# Altium footprint library Pezo_imp.PCBLIB: 98 footprints (part 5 of 7)
Each footprint in its own frame and in the unit in brackets; x right, y up, seen from the top. Pads: shape width x height; smd on the part's side, far side on the other; paste and mask are expansions set on the pad; w line width, h text height; cw(c..) or ccw(c..) is an arc to the next point about the centre after c.
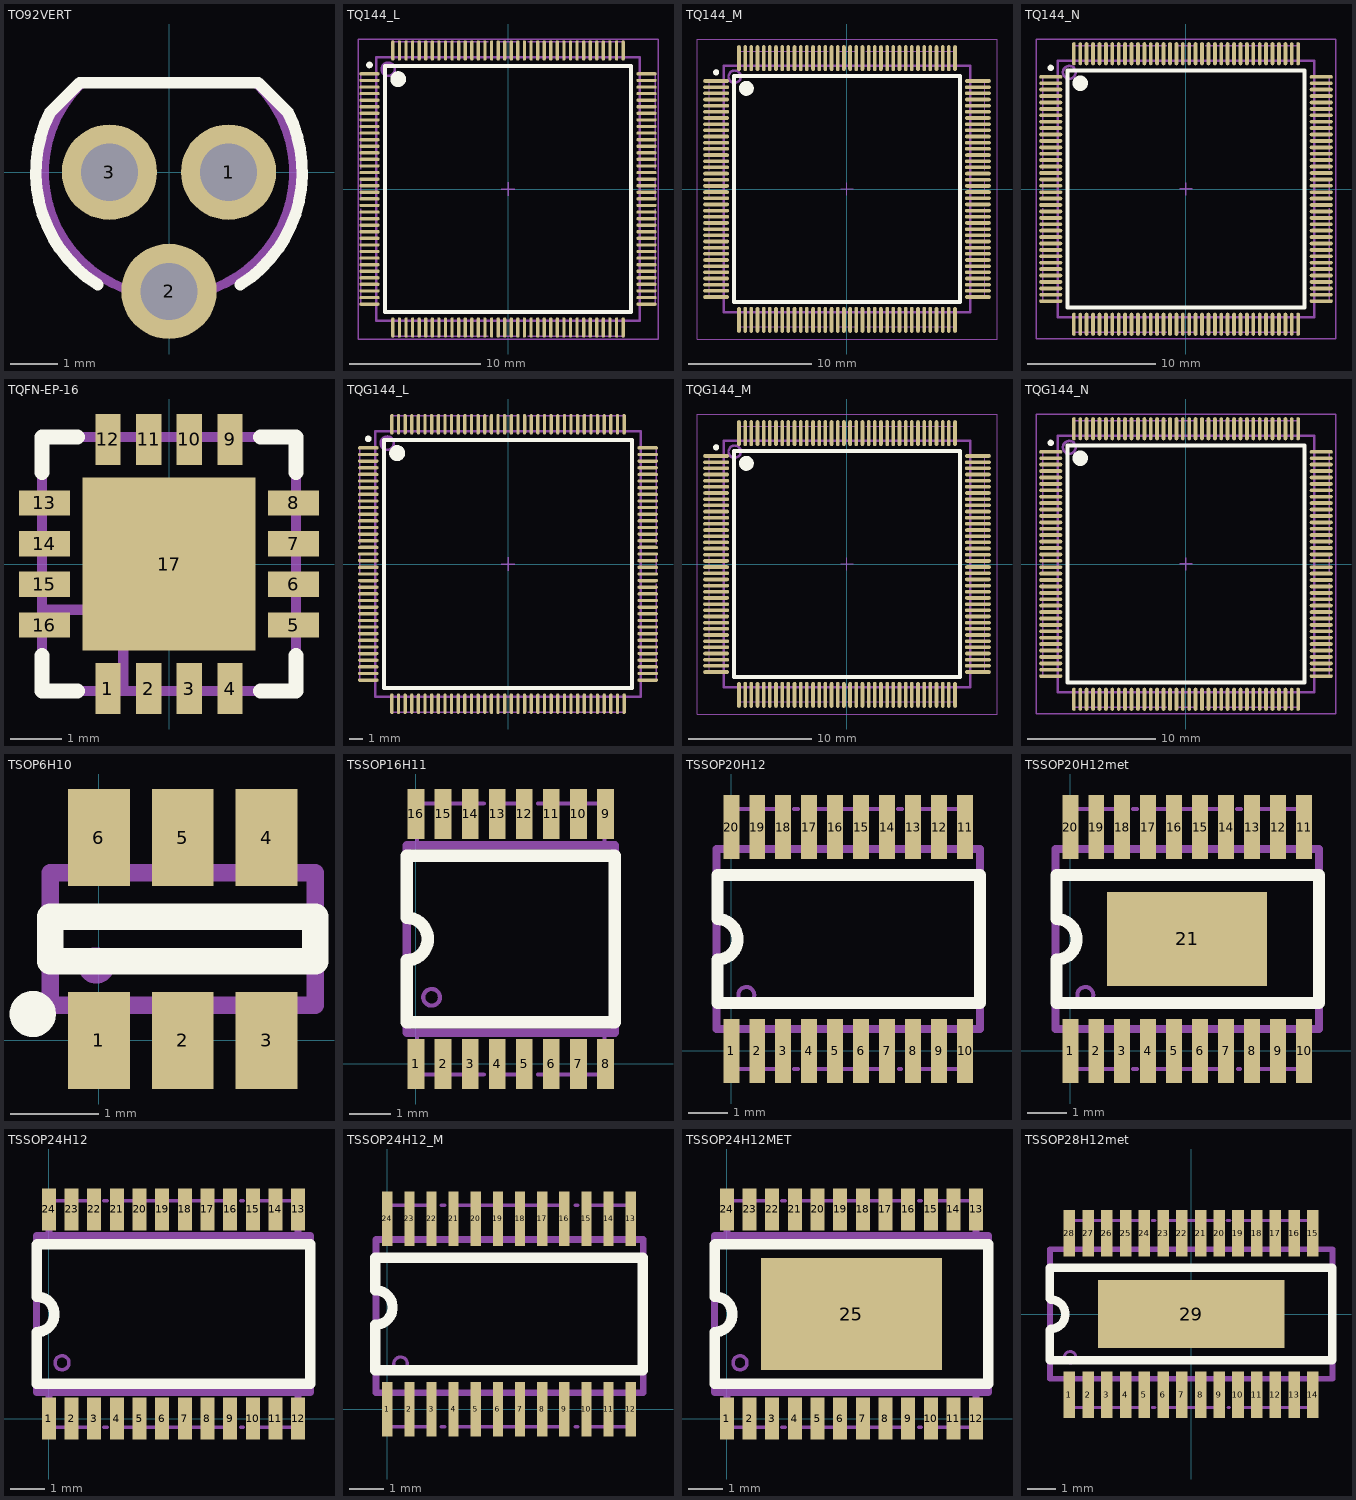
[diagram p4: the footprints below, top view; thin cyan lines are the x and y axes]

## TO92VERT [mil]
height 342.52
pads (3):
  round 80 hole 48: 1(50,0) 2(0,-100) 3(-50,0)
Top Overlay:
  lines w9.84: -100,50 -75,75 75,75 100,50 ; -99.97,50.06 ccw(c0,0) -59.74,-94.5 ; 59.74,-94.5 ccw(c0,0) 99.97,50.06
Mechanical 1:
  lines w7.87: -75,75 75,75 ; -74,74 ccw(c0,0) 74,74
  text "2" at -28.65,-114.48 h83.33
  text "1" at 21.35,-24.48 h83.33
  text "3" at -78.65,-24.48 h83.33
  text ".Designator" at -49.61,95.28 h59.06
3D body "TO92VERT.stp": height 342.52, standoff -118.11, extent -101.56,-109.82 101.56,62.99

## TQ144_L [mm] "Thin QFP, 144-Leads, Body 20x20mm, Pitch 0.5mm, IPC High Density"
height 1.6
pads (144):
  oval 1.55x0.25 smd: 1(-10.525,8.75) 2(-10.525,8.25) 3(-10.525,7.75) 4(-10.525,7.25) 5(-10.525,6.75) 6(-10.525,6.25) 7(-10.525,5.75) 8(-10.525,5.25) 9(-10.525,4.75) 10(-10.525,4.25) 11(-10.525,3.75) 12(-10.525,3.25) 13(-10.525,2.75) 14(-10.525,2.25) 15(-10.525,1.75) 16(-10.525,1.25) 17(-10.525,0.75) 18(-10.525,0.25) 19(-10.525,-0.25) 20(-10.525,-0.75) 21(-10.525,-1.25) 22(-10.525,-1.75) 23(-10.525,-2.25) 24(-10.525,-2.75) 25(-10.525,-3.25) 26(-10.525,-3.75) 27(-10.525,-4.25) 28(-10.525,-4.75) 29(-10.525,-5.25) 30(-10.525,-5.75) 31(-10.525,-6.25) 32(-10.525,-6.75) 33(-10.525,-7.25) 34(-10.525,-7.75) 35(-10.525,-8.25) 36(-10.525,-8.75) 73(10.525,-8.75) 74(10.525,-8.25) 75(10.525,-7.75) 76(10.525,-7.25) 77(10.525,-6.75) 78(10.525,-6.25) 79(10.525,-5.75) 80(10.525,-5.25) 81(10.525,-4.75) 82(10.525,-4.25) 83(10.525,-3.75) 84(10.525,-3.25) 85(10.525,-2.75) 86(10.525,-2.25) 87(10.525,-1.75) 88(10.525,-1.25) 89(10.525,-0.75) 90(10.525,-0.25) 91(10.525,0.25) 92(10.525,0.75) 93(10.525,1.25) 94(10.525,1.75) 95(10.525,2.25) 96(10.525,2.75) 97(10.525,3.25) 98(10.525,3.75) 99(10.525,4.25) 100(10.525,4.75) 101(10.525,5.25) 102(10.525,5.75) 103(10.525,6.25) 104(10.525,6.75) 105(10.525,7.25) 106(10.525,7.75) 107(10.525,8.25) 108(10.525,8.75)
  oval 0.25x1.55 smd: 37(-8.75,-10.525) 38(-8.25,-10.525) 39(-7.75,-10.525) 40(-7.25,-10.525) 41(-6.75,-10.525) 42(-6.25,-10.525) 43(-5.75,-10.525) 44(-5.25,-10.525) 45(-4.75,-10.525) 46(-4.25,-10.525) 47(-3.75,-10.525) 48(-3.25,-10.525) 49(-2.75,-10.525) 50(-2.25,-10.525) 51(-1.75,-10.525) 52(-1.25,-10.525) 53(-0.75,-10.525) 54(-0.25,-10.525) 55(0.25,-10.525) 56(0.75,-10.525) 57(1.25,-10.525) 58(1.75,-10.525) 59(2.25,-10.525) 60(2.75,-10.525) 61(3.25,-10.525) 62(3.75,-10.525) 63(4.25,-10.525) 64(4.75,-10.525) 65(5.25,-10.525) 66(5.75,-10.525) 67(6.25,-10.525) 68(6.75,-10.525) 69(7.25,-10.525) 70(7.75,-10.525) 71(8.25,-10.525) 72(8.75,-10.525) 109(8.75,10.525) 110(8.25,10.525) 111(7.75,10.525) 112(7.25,10.525) 113(6.75,10.525) 114(6.25,10.525) 115(5.75,10.525) 116(5.25,10.525) 117(4.75,10.525) 118(4.25,10.525) 119(3.75,10.525) 120(3.25,10.525) 121(2.75,10.525) 122(2.25,10.525) 123(1.75,10.525) 124(1.25,10.525) 125(0.75,10.525) 126(0.25,10.525) 127(-0.25,10.525) 128(-0.75,10.525) 129(-1.25,10.525) 130(-1.75,10.525) 131(-2.25,10.525) 132(-2.75,10.525) 133(-3.25,10.525) 134(-3.75,10.525) 135(-4.25,10.525) 136(-4.75,10.525) 137(-5.25,10.525) 138(-5.75,10.525) 139(-6.25,10.525) 140(-6.75,10.525) 141(-7.25,10.525) 142(-7.75,10.525) 143(-8.25,10.525) 144(-8.75,10.525)
Top Overlay:
  circle w0.25: c-10.525,9.425 r0.125
  circle w0.6: c-8.35,8.35 r0.3
  lines w0.3: -9.35,-9.35 -9.35,9.35 9.35,9.35 9.35,-9.35 -9.35,-9.35
Mechanical 1:
  circle w0.2: c-9.1,9.1 r0.5
  lines w0.1: -11.176,-8.763 -11.176,-1.5 ; -11.176,-0.762 -11.176,0.762 ; -11.176,1.5 -11.176,8.763 ; -8.763,-11.176 -1.5,-11.176 ; -8.763,11.176 -1.5,11.176 ; -0.762,-11.176 0.762,-11.176 ; -0.762,11.176 0.762,11.176 ; 1.5,-11.176 8.763,-11.176 ; 1.5,11.176 8.763,11.176 ; 11.176,-8.763 11.176,-1.5 ; 11.176,-0.762 11.176,0.762 ; 11.176,1.5 11.176,8.763
  lines w0.2: -11.176,-8.763 -10,-8.763 ; -11.176,8.763 -10,8.763 ; -8.763,-11.176 -8.763,-10 ; -8.763,10 -8.763,11.176 ; 8.763,-11.176 8.763,-10 ; 8.763,10 8.763,11.176 ; 10,-8.763 11.176,-8.763 ; 10,8.763 11.176,8.763 ; -10,-10 10,-10 10,10 -10,10 -10,-10
  text ".Comment" at -2.9,-1.7 h1.5
  text ".Designator" at -1.61,0.85 h1.5
Mechanical 15:
  lines w0.1: -0.5,0 0.5,0 ; 0,-0.5 0,0.5 ; -11.4,-11.4 -11.4,11.4 11.4,11.4 11.4,-11.4 -11.4,-11.4
3D body: height 1.6, standoff 0, extent -10,-10 10,10

## TQ144_M [mm] "Thin QFP, 144-Leads, Body 20x20mm, Pitch 0.5mm, IPC Low Density"
height 1.6
pads (144):
  oval 2.1x0.3 smd: 1(-10.6,8.75) 2(-10.6,8.25) 3(-10.6,7.75) 4(-10.6,7.25) 5(-10.6,6.75) 6(-10.6,6.25) 7(-10.6,5.75) 8(-10.6,5.25) 9(-10.6,4.75) 10(-10.6,4.25) 11(-10.6,3.75) 12(-10.6,3.25) 13(-10.6,2.75) 14(-10.6,2.25) 15(-10.6,1.75) 16(-10.6,1.25) 17(-10.6,0.75) 18(-10.6,0.25) 19(-10.6,-0.25) 20(-10.6,-0.75) 21(-10.6,-1.25) 22(-10.6,-1.75) 23(-10.6,-2.25) 24(-10.6,-2.75) 25(-10.6,-3.25) 26(-10.6,-3.75) 27(-10.6,-4.25) 28(-10.6,-4.75) 29(-10.6,-5.25) 30(-10.6,-5.75) 31(-10.6,-6.25) 32(-10.6,-6.75) 33(-10.6,-7.25) 34(-10.6,-7.75) 35(-10.6,-8.25) 36(-10.6,-8.75) 73(10.6,-8.75) 74(10.6,-8.25) 75(10.6,-7.75) 76(10.6,-7.25) 77(10.6,-6.75) 78(10.6,-6.25) 79(10.6,-5.75) 80(10.6,-5.25) 81(10.6,-4.75) 82(10.6,-4.25) 83(10.6,-3.75) 84(10.6,-3.25) 85(10.6,-2.75) 86(10.6,-2.25) 87(10.6,-1.75) 88(10.6,-1.25) 89(10.6,-0.75) 90(10.6,-0.25) 91(10.6,0.25) 92(10.6,0.75) 93(10.6,1.25) 94(10.6,1.75) 95(10.6,2.25) 96(10.6,2.75) 97(10.6,3.25) 98(10.6,3.75) 99(10.6,4.25) 100(10.6,4.75) 101(10.6,5.25) 102(10.6,5.75) 103(10.6,6.25) 104(10.6,6.75) 105(10.6,7.25) 106(10.6,7.75) 107(10.6,8.25) 108(10.6,8.75)
  oval 0.3x2.1 smd: 37(-8.75,-10.6) 38(-8.25,-10.6) 39(-7.75,-10.6) 40(-7.25,-10.6) 41(-6.75,-10.6) 42(-6.25,-10.6) 43(-5.75,-10.6) 44(-5.25,-10.6) 45(-4.75,-10.6) 46(-4.25,-10.6) 47(-3.75,-10.6) 48(-3.25,-10.6) 49(-2.75,-10.6) 50(-2.25,-10.6) 51(-1.75,-10.6) 52(-1.25,-10.6) 53(-0.75,-10.6) 54(-0.25,-10.6) 55(0.25,-10.6) 56(0.75,-10.6) 57(1.25,-10.6) 58(1.75,-10.6) 59(2.25,-10.6) 60(2.75,-10.6) 61(3.25,-10.6) 62(3.75,-10.6) 63(4.25,-10.6) 64(4.75,-10.6) 65(5.25,-10.6) 66(5.75,-10.6) 67(6.25,-10.6) 68(6.75,-10.6) 69(7.25,-10.6) 70(7.75,-10.6) 71(8.25,-10.6) 72(8.75,-10.6) 109(8.75,10.6) 110(8.25,10.6) 111(7.75,10.6) 112(7.25,10.6) 113(6.75,10.6) 114(6.25,10.6) 115(5.75,10.6) 116(5.25,10.6) 117(4.75,10.6) 118(4.25,10.6) 119(3.75,10.6) 120(3.25,10.6) 121(2.75,10.6) 122(2.25,10.6) 123(1.75,10.6) 124(1.25,10.6) 125(0.75,10.6) 126(0.25,10.6) 127(-0.25,10.6) 128(-0.75,10.6) 129(-1.25,10.6) 130(-1.75,10.6) 131(-2.25,10.6) 132(-2.75,10.6) 133(-3.25,10.6) 134(-3.75,10.6) 135(-4.25,10.6) 136(-4.75,10.6) 137(-5.25,10.6) 138(-5.75,10.6) 139(-6.25,10.6) 140(-6.75,10.6) 141(-7.25,10.6) 142(-7.75,10.6) 143(-8.25,10.6) 144(-8.75,10.6)
Top Overlay:
  circle w0.25: c-10.6,9.45 r0.125
  circle w0.6: c-8.15,8.15 r0.3
  lines w0.3: -9.15,-9.15 -9.15,9.15 9.15,9.15 9.15,-9.15 -9.15,-9.15
Mechanical 1:
  circle w0.2: c-9.1,9.1 r0.5
  lines w0.1: -11.176,-8.763 -11.176,-1.5 ; -11.176,-0.762 -11.176,0.762 ; -11.176,1.5 -11.176,8.763 ; -8.763,-11.176 -1.5,-11.176 ; -8.763,11.176 -1.5,11.176 ; -0.762,-11.176 0.762,-11.176 ; -0.762,11.176 0.762,11.176 ; 1.5,-11.176 8.763,-11.176 ; 1.5,11.176 8.763,11.176 ; 11.176,-8.763 11.176,-1.5 ; 11.176,-0.762 11.176,0.762 ; 11.176,1.5 11.176,8.763
  lines w0.2: -11.176,-8.763 -10,-8.763 ; -11.176,8.763 -10,8.763 ; -8.763,-11.176 -8.763,-10 ; -8.763,10 -8.763,11.176 ; 8.763,-11.176 8.763,-10 ; 8.763,10 8.763,11.176 ; 10,-8.763 11.176,-8.763 ; 10,8.763 11.176,8.763 ; -10,-10 -10,10 10,10 10,-10 -10,-10
  text ".Comment" at -2.9,-1.7 h1.5
  text ".Designator" at -1.61,0.85 h1.5
Mechanical 15:
  lines w0.1: -0.5,0 0.5,0 ; 0,-0.5 0,0.5 ; -12.15,-12.15 -12.15,12.15 12.15,12.15 12.15,-12.15 -12.15,-12.15
3D body: height 1.6, standoff 0, extent -10,-10 10,10

## TQ144_N [mm] "Thin QFP, 144-Leads, Body 20x20mm, Pitch 0.5mm, IPC Medium Density"
height 1.6
pads (144):
  oval 1.8x0.3 smd: 1(-10.55,8.75) 2(-10.55,8.25) 3(-10.55,7.75) 4(-10.55,7.25) 5(-10.55,6.75) 6(-10.55,6.25) 7(-10.55,5.75) 8(-10.55,5.25) 9(-10.55,4.75) 10(-10.55,4.25) 11(-10.55,3.75) 12(-10.55,3.25) 13(-10.55,2.75) 14(-10.55,2.25) 15(-10.55,1.75) 16(-10.55,1.25) 17(-10.55,0.75) 18(-10.55,0.25) 19(-10.55,-0.25) 20(-10.55,-0.75) 21(-10.55,-1.25) 22(-10.55,-1.75) 23(-10.55,-2.25) 24(-10.55,-2.75) 25(-10.55,-3.25) 26(-10.55,-3.75) 27(-10.55,-4.25) 28(-10.55,-4.75) 29(-10.55,-5.25) 30(-10.55,-5.75) 31(-10.55,-6.25) 32(-10.55,-6.75) 33(-10.55,-7.25) 34(-10.55,-7.75) 35(-10.55,-8.25) 36(-10.55,-8.75) 73(10.55,-8.75) 74(10.55,-8.25) 75(10.55,-7.75) 76(10.55,-7.25) 77(10.55,-6.75) 78(10.55,-6.25) 79(10.55,-5.75) 80(10.55,-5.25) 81(10.55,-4.75) 82(10.55,-4.25) 83(10.55,-3.75) 84(10.55,-3.25) 85(10.55,-2.75) 86(10.55,-2.25) 87(10.55,-1.75) 88(10.55,-1.25) 89(10.55,-0.75) 90(10.55,-0.25) 91(10.55,0.25) 92(10.55,0.75) 93(10.55,1.25) 94(10.55,1.75) 95(10.55,2.25) 96(10.55,2.75) 97(10.55,3.25) 98(10.55,3.75) 99(10.55,4.25) 100(10.55,4.75) 101(10.55,5.25) 102(10.55,5.75) 103(10.55,6.25) 104(10.55,6.75) 105(10.55,7.25) 106(10.55,7.75) 107(10.55,8.25) 108(10.55,8.75)
  oval 0.3x1.8 smd: 37(-8.75,-10.55) 38(-8.25,-10.55) 39(-7.75,-10.55) 40(-7.25,-10.55) 41(-6.75,-10.55) 42(-6.25,-10.55) 43(-5.75,-10.55) 44(-5.25,-10.55) 45(-4.75,-10.55) 46(-4.25,-10.55) 47(-3.75,-10.55) 48(-3.25,-10.55) 49(-2.75,-10.55) 50(-2.25,-10.55) 51(-1.75,-10.55) 52(-1.25,-10.55) 53(-0.75,-10.55) 54(-0.25,-10.55) 55(0.25,-10.55) 56(0.75,-10.55) 57(1.25,-10.55) 58(1.75,-10.55) 59(2.25,-10.55) 60(2.75,-10.55) 61(3.25,-10.55) 62(3.75,-10.55) 63(4.25,-10.55) 64(4.75,-10.55) 65(5.25,-10.55) 66(5.75,-10.55) 67(6.25,-10.55) 68(6.75,-10.55) 69(7.25,-10.55) 70(7.75,-10.55) 71(8.25,-10.55) 72(8.75,-10.55) 109(8.75,10.55) 110(8.25,10.55) 111(7.75,10.55) 112(7.25,10.55) 113(6.75,10.55) 114(6.25,10.55) 115(5.75,10.55) 116(5.25,10.55) 117(4.75,10.55) 118(4.25,10.55) 119(3.75,10.55) 120(3.25,10.55) 121(2.75,10.55) 122(2.25,10.55) 123(1.75,10.55) 124(1.25,10.55) 125(0.75,10.55) 126(0.25,10.55) 127(-0.25,10.55) 128(-0.75,10.55) 129(-1.25,10.55) 130(-1.75,10.55) 131(-2.25,10.55) 132(-2.75,10.55) 133(-3.25,10.55) 134(-3.75,10.55) 135(-4.25,10.55) 136(-4.75,10.55) 137(-5.25,10.55) 138(-5.75,10.55) 139(-6.25,10.55) 140(-6.75,10.55) 141(-7.25,10.55) 142(-7.75,10.55) 143(-8.25,10.55) 144(-8.75,10.55)
Top Overlay:
  circle w0.25: c-10.55,9.45 r0.125
  circle w0.6: c-8.25,8.25 r0.3
  lines w0.3: -9.25,-9.25 -9.25,9.25 9.25,9.25 9.25,-9.25 -9.25,-9.25
Mechanical 1:
  circle w0.2: c-9.1,9.1 r0.5
  lines w0.1: -11.176,-8.763 -11.176,-1.5 ; -11.176,-0.762 -11.176,0.762 ; -11.176,1.5 -11.176,8.763 ; -8.763,-11.176 -1.5,-11.176 ; -8.763,11.176 -1.5,11.176 ; -0.762,-11.176 0.762,-11.176 ; -0.762,11.176 0.762,11.176 ; 1.5,-11.176 8.763,-11.176 ; 1.5,11.176 8.763,11.176 ; 11.176,-8.763 11.176,-1.5 ; 11.176,-0.762 11.176,0.762 ; 11.176,1.5 11.176,8.763
  lines w0.2: -11.176,-8.763 -10,-8.763 ; -11.176,8.763 -10,8.763 ; -8.763,-11.176 -8.763,-10 ; -8.763,10 -8.763,11.176 ; 8.763,-11.176 8.763,-10 ; 8.763,10 8.763,11.176 ; 10,-8.763 11.176,-8.763 ; 10,8.763 11.176,8.763 ; -10,-10 -10,10 10,10 10,-10 -10,-10
  text ".Comment" at -2.9,-1.7 h1.5
  text ".Designator" at -1.61,0.85 h1.5
Mechanical 15:
  lines w0.1: -0.5,0 0.5,0 ; 0,-0.5 0,0.5 ; -11.7,-11.7 -11.7,11.7 11.7,11.7 11.7,-11.7 -11.7,-11.7
3D body: height 1.6, standoff 0, extent -10,-10 10,10

## TQFN-EP-16 [mm]
height 0.8
pads (17):
  rect 0.5x1 smd: 1(-1.2,-2.45) 2(-0.4,-2.45) 3(0.4,-2.45) 4(1.2,-2.45) 9(1.2,2.45) 10(0.4,2.45) 11(-0.4,2.45) 12(-1.2,2.45)
  rect 1x0.5 smd: 5(2.45,-1.2) 6(2.45,-0.4) 7(2.45,0.4) 8(2.45,1.2) 13(-2.45,1.2) 14(-2.45,0.4) 15(-2.45,-0.4) 16(-2.45,-1.2)
  rect 3.4x3.4 smd: 17(0,0)
Top Overlay:
  lines w0.3: -2.5,-1.8 -2.5,-2.5 -1.8,-2.5 ; -2.5,1.8 -2.5,2.5 -1.8,2.5 ; 1.8,-2.5 2.5,-2.5 2.5,-1.8 ; 1.8,2.5 2.5,2.5 2.5,1.8
Mechanical 1:
  lines w0.2: -2.5,-0.9 -0.9,-0.9 -0.9,-2.5 ; -2.5,-2.5 -2.5,2.5 2.5,2.5 2.5,-2.5 -2.5,-2.5
  text "13" at -2.26,0.84 h1.5
  text "1" at -1.42,-2.25 h1.5
  text "16" at -2.32,-1.75 h1.5
  text "4" at 1.01,-2.28 h1.5
  text "5" at 1.85,-1.7 h1.5
  text "8" at 1.88,0.89 h1.5
  text "12" at -1.54,1.62 h1.5
  text "9" at 1.04,1.59 h1.5
  text ".Comment" at -2.74,-3.89 h1.5
  text ".Designator" at -1.33,-0.08 h1.5
3D body "TQFN-EP-16.stp": height 0.8, standoff 0, extent -2.55,-2.55 2.55,2.55

## TQG144_L [mm] "Thin QFP, 144-Leads, Body 20x20mm, Pitch 0.5mm, IPC High Density"
height 1.6
pads (144):
  oval 1.55x0.25 smd: 1(-10.525,8.75) 2(-10.525,8.25) 3(-10.525,7.75) 4(-10.525,7.25) 5(-10.525,6.75) 6(-10.525,6.25) 7(-10.525,5.75) 8(-10.525,5.25) 9(-10.525,4.75) 10(-10.525,4.25) 11(-10.525,3.75) 12(-10.525,3.25) 13(-10.525,2.75) 14(-10.525,2.25) 15(-10.525,1.75) 16(-10.525,1.25) 17(-10.525,0.75) 18(-10.525,0.25) 19(-10.525,-0.25) 20(-10.525,-0.75) 21(-10.525,-1.25) 22(-10.525,-1.75) 23(-10.525,-2.25) 24(-10.525,-2.75) 25(-10.525,-3.25) 26(-10.525,-3.75) 27(-10.525,-4.25) 28(-10.525,-4.75) 29(-10.525,-5.25) 30(-10.525,-5.75) 31(-10.525,-6.25) 32(-10.525,-6.75) 33(-10.525,-7.25) 34(-10.525,-7.75) 35(-10.525,-8.25) 36(-10.525,-8.75) 73(10.525,-8.75) 74(10.525,-8.25) 75(10.525,-7.75) 76(10.525,-7.25) 77(10.525,-6.75) 78(10.525,-6.25) 79(10.525,-5.75) 80(10.525,-5.25) 81(10.525,-4.75) 82(10.525,-4.25) 83(10.525,-3.75) 84(10.525,-3.25) 85(10.525,-2.75) 86(10.525,-2.25) 87(10.525,-1.75) 88(10.525,-1.25) 89(10.525,-0.75) 90(10.525,-0.25) 91(10.525,0.25) 92(10.525,0.75) 93(10.525,1.25) 94(10.525,1.75) 95(10.525,2.25) 96(10.525,2.75) 97(10.525,3.25) 98(10.525,3.75) 99(10.525,4.25) 100(10.525,4.75) 101(10.525,5.25) 102(10.525,5.75) 103(10.525,6.25) 104(10.525,6.75) 105(10.525,7.25) 106(10.525,7.75) 107(10.525,8.25) 108(10.525,8.75)
  oval 0.25x1.55 smd: 37(-8.75,-10.525) 38(-8.25,-10.525) 39(-7.75,-10.525) 40(-7.25,-10.525) 41(-6.75,-10.525) 42(-6.25,-10.525) 43(-5.75,-10.525) 44(-5.25,-10.525) 45(-4.75,-10.525) 46(-4.25,-10.525) 47(-3.75,-10.525) 48(-3.25,-10.525) 49(-2.75,-10.525) 50(-2.25,-10.525) 51(-1.75,-10.525) 52(-1.25,-10.525) 53(-0.75,-10.525) 54(-0.25,-10.525) 55(0.25,-10.525) 56(0.75,-10.525) 57(1.25,-10.525) 58(1.75,-10.525) 59(2.25,-10.525) 60(2.75,-10.525) 61(3.25,-10.525) 62(3.75,-10.525) 63(4.25,-10.525) 64(4.75,-10.525) 65(5.25,-10.525) 66(5.75,-10.525) 67(6.25,-10.525) 68(6.75,-10.525) 69(7.25,-10.525) 70(7.75,-10.525) 71(8.25,-10.525) 72(8.75,-10.525) 109(8.75,10.525) 110(8.25,10.525) 111(7.75,10.525) 112(7.25,10.525) 113(6.75,10.525) 114(6.25,10.525) 115(5.75,10.525) 116(5.25,10.525) 117(4.75,10.525) 118(4.25,10.525) 119(3.75,10.525) 120(3.25,10.525) 121(2.75,10.525) 122(2.25,10.525) 123(1.75,10.525) 124(1.25,10.525) 125(0.75,10.525) 126(0.25,10.525) 127(-0.25,10.525) 128(-0.75,10.525) 129(-1.25,10.525) 130(-1.75,10.525) 131(-2.25,10.525) 132(-2.75,10.525) 133(-3.25,10.525) 134(-3.75,10.525) 135(-4.25,10.525) 136(-4.75,10.525) 137(-5.25,10.525) 138(-5.75,10.525) 139(-6.25,10.525) 140(-6.75,10.525) 141(-7.25,10.525) 142(-7.75,10.525) 143(-8.25,10.525) 144(-8.75,10.525)
Top Overlay:
  circle w0.25: c-10.525,9.425 r0.125
  circle w0.6: c-8.35,8.35 r0.3
  lines w0.3: -9.35,-9.35 -9.35,9.35 9.35,9.35 9.35,-9.35 -9.35,-9.35
Mechanical 1:
  circle w0.2: c-9.1,9.1 r0.5
  lines w0.1: -11.176,-8.763 -11.176,-1.5 ; -11.176,-0.762 -11.176,0.762 ; -11.176,1.5 -11.176,8.763 ; -8.763,-11.176 -1.5,-11.176 ; -8.763,11.176 -1.5,11.176 ; -0.762,-11.176 0.762,-11.176 ; -0.762,11.176 0.762,11.176 ; 1.5,-11.176 8.763,-11.176 ; 1.5,11.176 8.763,11.176 ; 11.176,-8.763 11.176,-1.5 ; 11.176,-0.762 11.176,0.762 ; 11.176,1.5 11.176,8.763
  lines w0.2: -11.176,-8.763 -10,-8.763 ; -11.176,8.763 -10,8.763 ; -8.763,-11.176 -8.763,-10 ; -8.763,10 -8.763,11.176 ; 8.763,-11.176 8.763,-10 ; 8.763,10 8.763,11.176 ; 10,-8.763 11.176,-8.763 ; 10,8.763 11.176,8.763 ; -10,-10 -10,10 10,10 10,-10 -10,-10
  text ".Designator" at -1.61,0.85 h1.5
  text ".Comment" at -2.9,-1.7 h1.5
Mechanical 15:
  lines w0.1: -0.5,0 0.5,0 ; 0,-0.5 0,0.5
3D body: height 1.6, standoff 0, extent -10,-10 10,10

## TQG144_M [mm] "Thin QFP, 144-Leads, Body 20x20mm, Pitch 0.5mm, IPC Low Density"
height 1.6
pads (144):
  oval 2.1x0.3 smd: 1(-10.6,8.75) 2(-10.6,8.25) 3(-10.6,7.75) 4(-10.6,7.25) 5(-10.6,6.75) 6(-10.6,6.25) 7(-10.6,5.75) 8(-10.6,5.25) 9(-10.6,4.75) 10(-10.6,4.25) 11(-10.6,3.75) 12(-10.6,3.25) 13(-10.6,2.75) 14(-10.6,2.25) 15(-10.6,1.75) 16(-10.6,1.25) 17(-10.6,0.75) 18(-10.6,0.25) 19(-10.6,-0.25) 20(-10.6,-0.75) 21(-10.6,-1.25) 22(-10.6,-1.75) 23(-10.6,-2.25) 24(-10.6,-2.75) 25(-10.6,-3.25) 26(-10.6,-3.75) 27(-10.6,-4.25) 28(-10.6,-4.75) 29(-10.6,-5.25) 30(-10.6,-5.75) 31(-10.6,-6.25) 32(-10.6,-6.75) 33(-10.6,-7.25) 34(-10.6,-7.75) 35(-10.6,-8.25) 36(-10.6,-8.75) 73(10.6,-8.75) 74(10.6,-8.25) 75(10.6,-7.75) 76(10.6,-7.25) 77(10.6,-6.75) 78(10.6,-6.25) 79(10.6,-5.75) 80(10.6,-5.25) 81(10.6,-4.75) 82(10.6,-4.25) 83(10.6,-3.75) 84(10.6,-3.25) 85(10.6,-2.75) 86(10.6,-2.25) 87(10.6,-1.75) 88(10.6,-1.25) 89(10.6,-0.75) 90(10.6,-0.25) 91(10.6,0.25) 92(10.6,0.75) 93(10.6,1.25) 94(10.6,1.75) 95(10.6,2.25) 96(10.6,2.75) 97(10.6,3.25) 98(10.6,3.75) 99(10.6,4.25) 100(10.6,4.75) 101(10.6,5.25) 102(10.6,5.75) 103(10.6,6.25) 104(10.6,6.75) 105(10.6,7.25) 106(10.6,7.75) 107(10.6,8.25) 108(10.6,8.75)
  oval 0.3x2.1 smd: 37(-8.75,-10.6) 38(-8.25,-10.6) 39(-7.75,-10.6) 40(-7.25,-10.6) 41(-6.75,-10.6) 42(-6.25,-10.6) 43(-5.75,-10.6) 44(-5.25,-10.6) 45(-4.75,-10.6) 46(-4.25,-10.6) 47(-3.75,-10.6) 48(-3.25,-10.6) 49(-2.75,-10.6) 50(-2.25,-10.6) 51(-1.75,-10.6) 52(-1.25,-10.6) 53(-0.75,-10.6) 54(-0.25,-10.6) 55(0.25,-10.6) 56(0.75,-10.6) 57(1.25,-10.6) 58(1.75,-10.6) 59(2.25,-10.6) 60(2.75,-10.6) 61(3.25,-10.6) 62(3.75,-10.6) 63(4.25,-10.6) 64(4.75,-10.6) 65(5.25,-10.6) 66(5.75,-10.6) 67(6.25,-10.6) 68(6.75,-10.6) 69(7.25,-10.6) 70(7.75,-10.6) 71(8.25,-10.6) 72(8.75,-10.6) 109(8.75,10.6) 110(8.25,10.6) 111(7.75,10.6) 112(7.25,10.6) 113(6.75,10.6) 114(6.25,10.6) 115(5.75,10.6) 116(5.25,10.6) 117(4.75,10.6) 118(4.25,10.6) 119(3.75,10.6) 120(3.25,10.6) 121(2.75,10.6) 122(2.25,10.6) 123(1.75,10.6) 124(1.25,10.6) 125(0.75,10.6) 126(0.25,10.6) 127(-0.25,10.6) 128(-0.75,10.6) 129(-1.25,10.6) 130(-1.75,10.6) 131(-2.25,10.6) 132(-2.75,10.6) 133(-3.25,10.6) 134(-3.75,10.6) 135(-4.25,10.6) 136(-4.75,10.6) 137(-5.25,10.6) 138(-5.75,10.6) 139(-6.25,10.6) 140(-6.75,10.6) 141(-7.25,10.6) 142(-7.75,10.6) 143(-8.25,10.6) 144(-8.75,10.6)
Top Overlay:
  circle w0.25: c-10.6,9.45 r0.125
  circle w0.6: c-8.15,8.15 r0.3
  lines w0.3: -9.15,-9.15 -9.15,9.15 9.15,9.15 9.15,-9.15 -9.15,-9.15
Mechanical 1:
  circle w0.2: c-9.1,9.1 r0.5
  lines w0.1: -11.176,-8.763 -11.176,-1.5 ; -11.176,-0.762 -11.176,0.762 ; -11.176,1.5 -11.176,8.763 ; -8.763,-11.176 -1.5,-11.176 ; -8.763,11.176 -1.5,11.176 ; -0.762,-11.176 0.762,-11.176 ; -0.762,11.176 0.762,11.176 ; 1.5,-11.176 8.763,-11.176 ; 1.5,11.176 8.763,11.176 ; 11.176,-8.763 11.176,-1.5 ; 11.176,-0.762 11.176,0.762 ; 11.176,1.5 11.176,8.763
  lines w0.2: -11.176,-8.763 -10,-8.763 ; -11.176,8.763 -10,8.763 ; -8.763,-11.176 -8.763,-10 ; -8.763,10 -8.763,11.176 ; 8.763,-11.176 8.763,-10 ; 8.763,10 8.763,11.176 ; 10,-8.763 11.176,-8.763 ; 10,8.763 11.176,8.763 ; -10,-10 10,-10 10,10 -10,10 -10,-10
  text ".Designator" at -1.61,0.85 h1.5
  text ".Comment" at -2.9,-1.7 h1.5
Mechanical 13:
  lines w0.1: 10,-10 10,10
Mechanical 15:
  lines w0.1: -0.5,0 0.5,0 ; 0,-0.5 0,0.5 ; -12.15,-12.15 -12.15,12.15 12.15,12.15 12.15,-12.15 -12.15,-12.15
3D body: height 1.6, standoff 0, extent -10,-10 10,10

## TQG144_N [mm] "Thin QFP, 144-Leads, Body 20x20mm, Pitch 0.5mm, IPC Medium Density"
height 1.6
pads (144):
  oval 1.8x0.3 smd: 1(-10.55,8.75) 2(-10.55,8.25) 3(-10.55,7.75) 4(-10.55,7.25) 5(-10.55,6.75) 6(-10.55,6.25) 7(-10.55,5.75) 8(-10.55,5.25) 9(-10.55,4.75) 10(-10.55,4.25) 11(-10.55,3.75) 12(-10.55,3.25) 13(-10.55,2.75) 14(-10.55,2.25) 15(-10.55,1.75) 16(-10.55,1.25) 17(-10.55,0.75) 18(-10.55,0.25) 19(-10.55,-0.25) 20(-10.55,-0.75) 21(-10.55,-1.25) 22(-10.55,-1.75) 23(-10.55,-2.25) 24(-10.55,-2.75) 25(-10.55,-3.25) 26(-10.55,-3.75) 27(-10.55,-4.25) 28(-10.55,-4.75) 29(-10.55,-5.25) 30(-10.55,-5.75) 31(-10.55,-6.25) 32(-10.55,-6.75) 33(-10.55,-7.25) 34(-10.55,-7.75) 35(-10.55,-8.25) 36(-10.55,-8.75) 73(10.55,-8.75) 74(10.55,-8.25) 75(10.55,-7.75) 76(10.55,-7.25) 77(10.55,-6.75) 78(10.55,-6.25) 79(10.55,-5.75) 80(10.55,-5.25) 81(10.55,-4.75) 82(10.55,-4.25) 83(10.55,-3.75) 84(10.55,-3.25) 85(10.55,-2.75) 86(10.55,-2.25) 87(10.55,-1.75) 88(10.55,-1.25) 89(10.55,-0.75) 90(10.55,-0.25) 91(10.55,0.25) 92(10.55,0.75) 93(10.55,1.25) 94(10.55,1.75) 95(10.55,2.25) 96(10.55,2.75) 97(10.55,3.25) 98(10.55,3.75) 99(10.55,4.25) 100(10.55,4.75) 101(10.55,5.25) 102(10.55,5.75) 103(10.55,6.25) 104(10.55,6.75) 105(10.55,7.25) 106(10.55,7.75) 107(10.55,8.25) 108(10.55,8.75)
  oval 0.3x1.8 smd: 37(-8.75,-10.55) 38(-8.25,-10.55) 39(-7.75,-10.55) 40(-7.25,-10.55) 41(-6.75,-10.55) 42(-6.25,-10.55) 43(-5.75,-10.55) 44(-5.25,-10.55) 45(-4.75,-10.55) 46(-4.25,-10.55) 47(-3.75,-10.55) 48(-3.25,-10.55) 49(-2.75,-10.55) 50(-2.25,-10.55) 51(-1.75,-10.55) 52(-1.25,-10.55) 53(-0.75,-10.55) 54(-0.25,-10.55) 55(0.25,-10.55) 56(0.75,-10.55) 57(1.25,-10.55) 58(1.75,-10.55) 59(2.25,-10.55) 60(2.75,-10.55) 61(3.25,-10.55) 62(3.75,-10.55) 63(4.25,-10.55) 64(4.75,-10.55) 65(5.25,-10.55) 66(5.75,-10.55) 67(6.25,-10.55) 68(6.75,-10.55) 69(7.25,-10.55) 70(7.75,-10.55) 71(8.25,-10.55) 72(8.75,-10.55) 109(8.75,10.55) 110(8.25,10.55) 111(7.75,10.55) 112(7.25,10.55) 113(6.75,10.55) 114(6.25,10.55) 115(5.75,10.55) 116(5.25,10.55) 117(4.75,10.55) 118(4.25,10.55) 119(3.75,10.55) 120(3.25,10.55) 121(2.75,10.55) 122(2.25,10.55) 123(1.75,10.55) 124(1.25,10.55) 125(0.75,10.55) 126(0.25,10.55) 127(-0.25,10.55) 128(-0.75,10.55) 129(-1.25,10.55) 130(-1.75,10.55) 131(-2.25,10.55) 132(-2.75,10.55) 133(-3.25,10.55) 134(-3.75,10.55) 135(-4.25,10.55) 136(-4.75,10.55) 137(-5.25,10.55) 138(-5.75,10.55) 139(-6.25,10.55) 140(-6.75,10.55) 141(-7.25,10.55) 142(-7.75,10.55) 143(-8.25,10.55) 144(-8.75,10.55)
Top Overlay:
  circle w0.6: c-8.25,8.25 r0.3
  circle w0.25: c-10.55,9.45 r0.125
  lines w0.3: -9.25,-9.25 9.25,-9.25 9.25,9.25 -9.25,9.25 -9.25,-9.25
Mechanical 1:
  circle w0.2: c-9.1,9.1 r0.5
  lines w0.1: -11.176,-8.763 -11.176,-1.5 ; -11.176,-0.762 -11.176,0.762 ; -11.176,1.5 -11.176,8.763 ; -8.763,-11.176 -1.5,-11.176 ; -8.763,11.176 -1.5,11.176 ; -0.762,-11.176 0.762,-11.176 ; -0.762,11.176 0.762,11.176 ; 1.5,-11.176 8.763,-11.176 ; 1.5,11.176 8.763,11.176 ; 11.176,-8.763 11.176,-1.5 ; 11.176,-0.762 11.176,0.762 ; 11.176,1.5 11.176,8.763
  lines w0.2: -11.176,-8.763 -10,-8.763 ; -11.176,8.763 -10,8.763 ; -8.763,-11.176 -8.763,-10 ; -8.763,10 -8.763,11.176 ; 8.763,-11.176 8.763,-10 ; 8.763,10 8.763,11.176 ; 10,-8.763 11.176,-8.763 ; 10,8.763 11.176,8.763 ; -10,-10 -10,10 10,10 10,-10 -10,-10
  text ".Designator" at -1.61,0.85 h1.5
  text ".Comment" at -2.9,-1.7 h1.5
Mechanical 15:
  lines w0.1: -0.5,0 0.5,0 ; 0,-0.5 0,0.5 ; -11.7,-11.7 11.7,-11.7 11.7,11.7 -11.7,11.7 -11.7,-11.7
3D body: height 1.6, standoff 0, extent -10,-10 10,10

## TSOP6H10 [mm]
height 1
pads (6):
  rect 0.7x1.1 smd: 1(0,0) 2(0.95,0) 3(1.9,0) 4(1.9,2.3) 5(0.95,2.3) 6(0,2.3)
Top Overlay:
  circle w0.3: c-0.75,0.3 r0.112
  lines w0.3: -0.55,0.9 2.45,0.9 2.45,1.4 -0.55,1.4 -0.55,0.9
Mechanical 1:
  circle w0.25: c-0.03,0.85 r0.08
  lines w0.2: 0,-0.25 0,0.4 ; 0,1.9 0,2.55 ; 0.95,1.9 0.95,2.55 ; 1.9,-0.25 1.9,0.4 ; 1.9,1.9 1.9,2.55 ; -0.55,0.4 -0.55,1.9 2.45,1.9 2.45,0.4 -0.55,0.4 ; 0.95,-0.25 0.95,0.4 0.95,-0.25
  text ".Designator" at -0.24,2.87 h1.5
  text ".Comment" at -1.82,-1.51 h1.5
  text "6" at -1.1,2.2 h1.5
3D body "TSOP6h11.stp": height 1.11, standoff 0, extent -0.5,-0.25 2.4,2.55

## TSSOP16H11 [mm]
height 1.1
pads (16):
  rect 0.4x1.2 smd: 1(0,0) 2(0.65,0) 3(1.3,0) 4(1.95,0) 5(2.6,0) 6(3.25,0) 7(3.9,0) 8(4.55,0) 9(4.55,6) 10(3.9,6) 11(3.25,6) 12(2.6,6) 13(1.95,6) 14(1.3,6) 15(0.65,6) 16(0,6)
Top Overlay:
  lines w0.3: -0.225,1 -0.225,2.492 ccw(c-0.225,3) -0.225,3.508 -0.225,5 4.775,5 4.775,1 -0.225,1
Mechanical 1:
  circle w0.1: c0.375,1.6 r0.2
  lines w0.1: 0.025,0.75 0.025,-0.25 1.625,-0.25 ; 0.025,5.25 0.025,6.25 1.625,6.25 ; 2.075,-0.25 2.475,-0.25 ; 2.075,6.25 2.475,6.25 ; 2.925,-0.25 4.525,-0.25 4.525,0.75 ; 2.925,6.25 4.525,6.25 4.525,5.25
  lines w0.2: -0.225,0.75 -0.225,5.25 4.775,5.25 4.775,0.75 -0.225,0.75
  text ".Designator" at 1.62,3.58 h1.5
  text ".Comment" at 0.36,2.1 h1.5
  text "16" at 0.2,3.87 h1.5
3D body "TSSOP16h11.stp": height 1.11, standoff 0, extent -0.375,-0.3 4.925,6.3

## TSSOP20H12 [mm]
height 1.2
pads (20):
  rect 0.4x1.6 smd: 1(0,0) 2(0.65,0) 3(1.3,0) 4(1.95,0) 5(2.6,0) 6(3.25,0) 7(3.9,0) 8(4.55,0) 9(5.2,0) 10(5.85,0) 11(5.85,5.6) 12(5.2,5.6) 13(4.55,5.6) 14(3.9,5.6) 15(3.25,5.6) 16(2.6,5.6) 17(1.95,5.6) 18(1.3,5.6) 19(0.65,5.6) 20(0,5.6)
Top Overlay:
  lines w0.3: -0.35,1.2 -0.35,2.284 ccw(c-0.35,2.792) -0.35,3.3 -0.35,4.4 6.225,4.4 6.225,1.2 -0.35,1.2
Mechanical 1:
  circle w0.1: c0.375,1.4 r0.2
  lines w0.1: 0,6.05 1.3,6.05 ; 0.025,-0.45 1.3,-0.45 ; 1.575,-0.45 1.675,-0.45 ; 1.575,6.05 1.675,6.05 ; 1.95,-0.45 3.9,-0.45 ; 1.95,6.05 3.9,6.05 ; 4.175,6.05 4.275,6.05 ; 4.2,-0.45 4.25,-0.45 ; 4.55,-0.45 5.85,-0.45 ; 4.55,6.05 5.85,6.05
  lines w0.2: 0,-0.45 0,0.55 ; 0,5.05 0,6.05 ; 5.85,-0.45 5.85,0.55 ; 5.85,5.05 5.85,6.05 ; -0.375,0.55 -0.375,5.05 6.225,5.05 6.225,0.55 -0.375,0.55
  text ".Designator" at 1.98,3.58 h1.5
  text ".Comment" at 0.39,1.88 h1.5
  text "20" at 0.3,3.55 h1.5
3D body "TSSOP20h12.stp": height 1.21, standoff 0, extent -0.375,-0.5 6.225,6.1

## TSSOP20H12met [mm]
height 1.2
pads (21):
  rect 0.4x1.6 smd: 1(0,0) 2(0.65,0) 3(1.3,0) 4(1.95,0) 5(2.6,0) 6(3.25,0) 7(3.9,0) 8(4.55,0) 9(5.2,0) 10(5.85,0) 11(5.85,5.6) 12(5.2,5.6) 13(4.55,5.6) 14(3.9,5.6) 15(3.25,5.6) 16(2.6,5.6) 17(1.95,5.6) 18(1.3,5.6) 19(0.65,5.6) 20(0,5.6)
  rect 4x2.35 smd: 21(2.925,2.8)
Top Overlay:
  lines w0.3: -0.35,1.2 -0.35,2.284 ccw(c-0.35,2.792) -0.35,3.3 -0.35,4.4 6.225,4.4 6.225,1.2 -0.35,1.2
Mechanical 1:
  circle w0.1: c0.375,1.4 r0.2
  lines w0.1: 0,6.05 1.3,6.05 ; 0.025,-0.45 1.3,-0.45 ; 1.575,-0.45 1.675,-0.45 ; 1.575,6.05 1.675,6.05 ; 1.95,-0.45 3.9,-0.45 ; 1.95,6.05 3.9,6.05 ; 4.175,6.05 4.275,6.05 ; 4.2,-0.45 4.25,-0.45 ; 4.55,-0.45 5.85,-0.45 ; 4.55,6.05 5.85,6.05
  lines w0.2: 0,-0.45 0,0.55 ; 0,5.05 0,6.05 ; 5.85,-0.45 5.85,0.55 ; 5.85,5.05 5.85,6.05 ; -0.375,0.55 -0.375,5.05 6.225,5.05 6.225,0.55 -0.375,0.55
  text "20" at 0.3,3.55 h1.5
  text ".Comment" at 0.21,1.91 h1.5
  text ".Designator" at 1.8,3.61 h1.5
3D body "TSSOP20h12.stp": height 1.21, standoff 0, extent -0.375,-0.5 6.225,6.1

## TSSOP24H12 [mm]
height 1.2
pads (24):
  rect 0.4x1.2 smd: 1(0,0) 2(0.65,0) 3(1.3,0) 4(1.95,0) 5(2.6,0) 6(3.25,0) 7(3.9,0) 8(4.55,0) 9(5.2,0) 10(5.85,0) 11(6.5,0) 12(7.15,0) 13(7.15,6) 14(6.5,6) 15(5.85,6) 16(5.2,6) 17(4.55,6) 18(3.9,6) 19(3.25,6) 20(2.6,6) 21(1.95,6) 22(1.3,6) 23(0.65,6) 24(0,6)
Top Overlay:
  lines w0.3: -0.35,1 -0.35,2.484 ccw(c-0.35,2.992) -0.35,3.5 -0.35,4.992 -0.342,5 7.5,5 7.5,1 -0.35,1
Mechanical 1:
  circle w0.1: c0.375,1.6 r0.2
  lines w0.1: 0,6.25 1.3,6.25 ; 0.025,-0.25 1.3,-0.25 ; 1.575,-0.25 1.675,-0.25 ; 1.575,6.25 1.675,6.25 ; 1.95,-0.25 5.2,-0.25 ; 1.95,6.25 5.2,6.25 ; 5.5,-0.25 5.575,-0.25 ; 5.5,6.25 5.575,6.25 ; 5.85,-0.25 7.15,-0.25 ; 5.85,6.25 7.15,6.25
  lines w0.2: 0,-0.25 0,0.75 ; 0,5.25 0,6.25 ; 7.15,-0.25 7.15,0.75 ; 7.15,5.25 7.15,6.25 ; -0.35,0.75 -0.35,5.25 7.5,5.25 7.5,0.75 -0.35,0.75
  text "24" at 0.3,3.75 h1.5
  text ".Comment" at 0.51,2.11 h1.5
  text ".Designator" at 2.1,3.81 h1.5
3D body "TSSOP24h12.stp": height 1.21, standoff 0, extent -0.375,-0.3 7.525,6.3

## TSSOP24H12_M [mm]
height 1.2
pads (24):
  rect 0.3x1.6 smd: 1(0,0) 2(0.65,0) 3(1.3,0) 4(1.95,0) 5(2.6,0) 6(3.25,0) 7(3.9,0) 8(4.55,0) 9(5.2,0) 10(5.85,0) 11(6.5,0) 12(7.15,0) 13(7.15,5.6) 14(6.5,5.6) 15(5.85,5.6) 16(5.2,5.6) 17(4.55,5.6) 18(3.9,5.6) 19(3.25,5.6) 20(2.6,5.6) 21(1.95,5.6) 22(1.3,5.6) 23(0.65,5.6) 24(0,5.6)
Top Overlay:
  lines w0.3: -0.35,4.45 -0.35,3.5 cw(c-0.35,2.992) -0.35,2.484 -0.35,1.15 7.5,1.15 7.5,4.45 -0.342,4.45
Mechanical 1:
  circle w0.1: c0.392,1.338 r0.2
  lines w0.1: 0.017,5.988 1.317,5.988 ; 0.042,-0.512 1.317,-0.512 ; 1.592,-0.512 1.692,-0.512 ; 1.592,5.988 1.692,5.988 ; 1.967,-0.512 5.217,-0.512 ; 1.967,5.988 5.217,5.988 ; 5.517,-0.512 5.592,-0.512 ; 5.517,5.988 5.592,5.988 ; 5.867,-0.512 7.167,-0.512 ; 5.867,5.988 7.167,5.988
  lines w0.2: 0.017,-0.512 0.017,0.488 ; 0.017,4.988 0.017,5.988 ; 7.167,-0.512 7.167,0.488 ; 7.167,4.988 7.167,5.988 ; -0.333,0.488 -0.333,4.988 7.517,4.988 7.517,0.488 -0.333,0.488
  text "24" at 0.317,3.488 h1.5
  text ".Comment" at 0.527,1.848 h1.5
  text ".Designator" at 2.117,3.548 h1.5
3D body "TSSOP24h12.stp": height 1.21, standoff 0, extent -0.375,-0.55 7.525,6.05

## TSSOP24H12MET [mm]
height 1.2
pads (25):
  rect 0.4x1.2 smd: 1(0,0) 2(0.65,0) 3(1.3,0) 4(1.95,0) 5(2.6,0) 6(3.25,0) 7(3.9,0) 8(4.55,0) 9(5.2,0) 10(5.85,0) 11(6.5,0) 12(7.15,0) 13(7.15,6) 14(6.5,6) 15(5.85,6) 16(5.2,6) 17(4.55,6) 18(3.9,6) 19(3.25,6) 20(2.6,6) 21(1.95,6) 22(1.3,6) 23(0.65,6) 24(0,6)
  rect 5.2x3.2 smd: 25(3.575,3)
Top Overlay:
  lines w0.3: -0.35,1 7.5,1 7.5,5 -0.342,5 -0.35,4.992 -0.35,3.5 cw(c-0.35,2.992) -0.35,2.484 -0.35,1
Mechanical 1:
  circle w0.1: c0.375,1.6 r0.2
  lines w0.1: 0,6.25 1.3,6.25 ; 0.025,-0.25 1.3,-0.25 ; 1.575,-0.25 1.675,-0.25 ; 1.575,6.25 1.675,6.25 ; 1.95,-0.25 5.2,-0.25 ; 1.95,6.25 5.2,6.25 ; 5.5,-0.25 5.575,-0.25 ; 5.5,6.25 5.575,6.25 ; 5.85,-0.25 7.15,-0.25 ; 5.85,6.25 7.15,6.25
  lines w0.2: 0,-0.25 0,0.75 ; 0,5.25 0,6.25 ; 7.15,-0.25 7.15,0.75 ; 7.15,5.25 7.15,6.25 ; -0.35,0.75 7.5,0.75 7.5,5.25 -0.35,5.25 -0.35,0.75
  text ".Designator" at 2.1,3.81 h1.5
  text ".Comment" at 0.51,2.11 h1.5
  text "24" at 0.3,3.75 h1.5
3D body "TSSOP24h12.stp": height 1.21, standoff 0, extent -0.375,-0.3 7.525,6.3

## TSSOP28H12met [mm]
height 1.2
pads (29):
  rect 0.4x1.6 smd: 1(-4.225,-2.8) 2(-3.575,-2.8) 3(-2.925,-2.8) 4(-2.275,-2.8) 5(-1.625,-2.8) 6(-0.975,-2.8) 7(-0.325,-2.8) 8(0.325,-2.8) 9(0.975,-2.8) 10(1.625,-2.8) 11(2.275,-2.8) 12(2.925,-2.8) 13(3.575,-2.8) 14(4.225,-2.8) 15(4.225,2.8) 16(3.575,2.8) 17(2.925,2.8) 18(2.275,2.8) 19(1.625,2.8) 20(0.975,2.8) 21(0.325,2.8) 22(-0.325,2.8) 23(-0.975,2.8) 24(-1.625,2.8) 25(-2.275,2.8) 26(-2.925,2.8) 27(-3.575,2.8) 28(-4.225,2.8)
  rect 6.46x2.35 smd: 29(0,0)
Top Overlay:
  lines w0.3: -4.9,-1.6 4.9,-1.6 4.9,1.6 -4.9,1.6 -4.9,0.525 -4.875,0.5 cw(c-4.875,-0.008) -4.875,-0.516 -4.9,-0.541 -4.9,-1.6
Mechanical 1:
  circle w0.1: c-4.2,-1.5 r0.2
  lines w0.1: -4.225,-3.25 -1.625,-3.25 ; -4.225,3.25 -1.625,3.25 ; -1.35,-3.25 -1.25,-3.25 ; -1.35,3.25 -1.25,3.25 ; -0.975,-3.25 0.975,-3.25 ; -0.975,3.25 0.975,3.25 ; 1.25,3.25 1.35,3.25 ; 1.275,-3.25 1.325,-3.25 ; 1.625,-3.25 4.225,-3.25 ; 1.625,3.25 4.225,3.25
  lines w0.2: -4.225,-3.25 -4.225,-2.25 ; -4.225,2.25 -4.225,3.25 ; 4.225,-3.25 4.225,-2.25 ; 4.225,2.25 4.225,3.25 ; -4.9,-2.25 4.9,-2.25 4.9,2.25 -4.9,2.25 -4.9,-2.25
  text "28" at -4.55,0.65 h1.5
  text ".Comment" at -3.805,-1.02 h1.5
  text ".Designator" at -2.215,0.68 h1.5
3D body "TSSOP28h12.stp": height 1.21, standoff 0, extent -4.9,-3.3 4.9,3.3